# Altium footprint library Connectors.PcbLib: 69 footprints (part 4 of 5)
Each footprint in its own frame and in the unit in brackets; x right, y up, seen from the top. Pads: shape width x height; smd on the part's side, far side on the other; paste and mask are expansions set on the pad; w line width, h text height; cw(c..) or ccw(c..) is an arc to the next point about the centre after c.
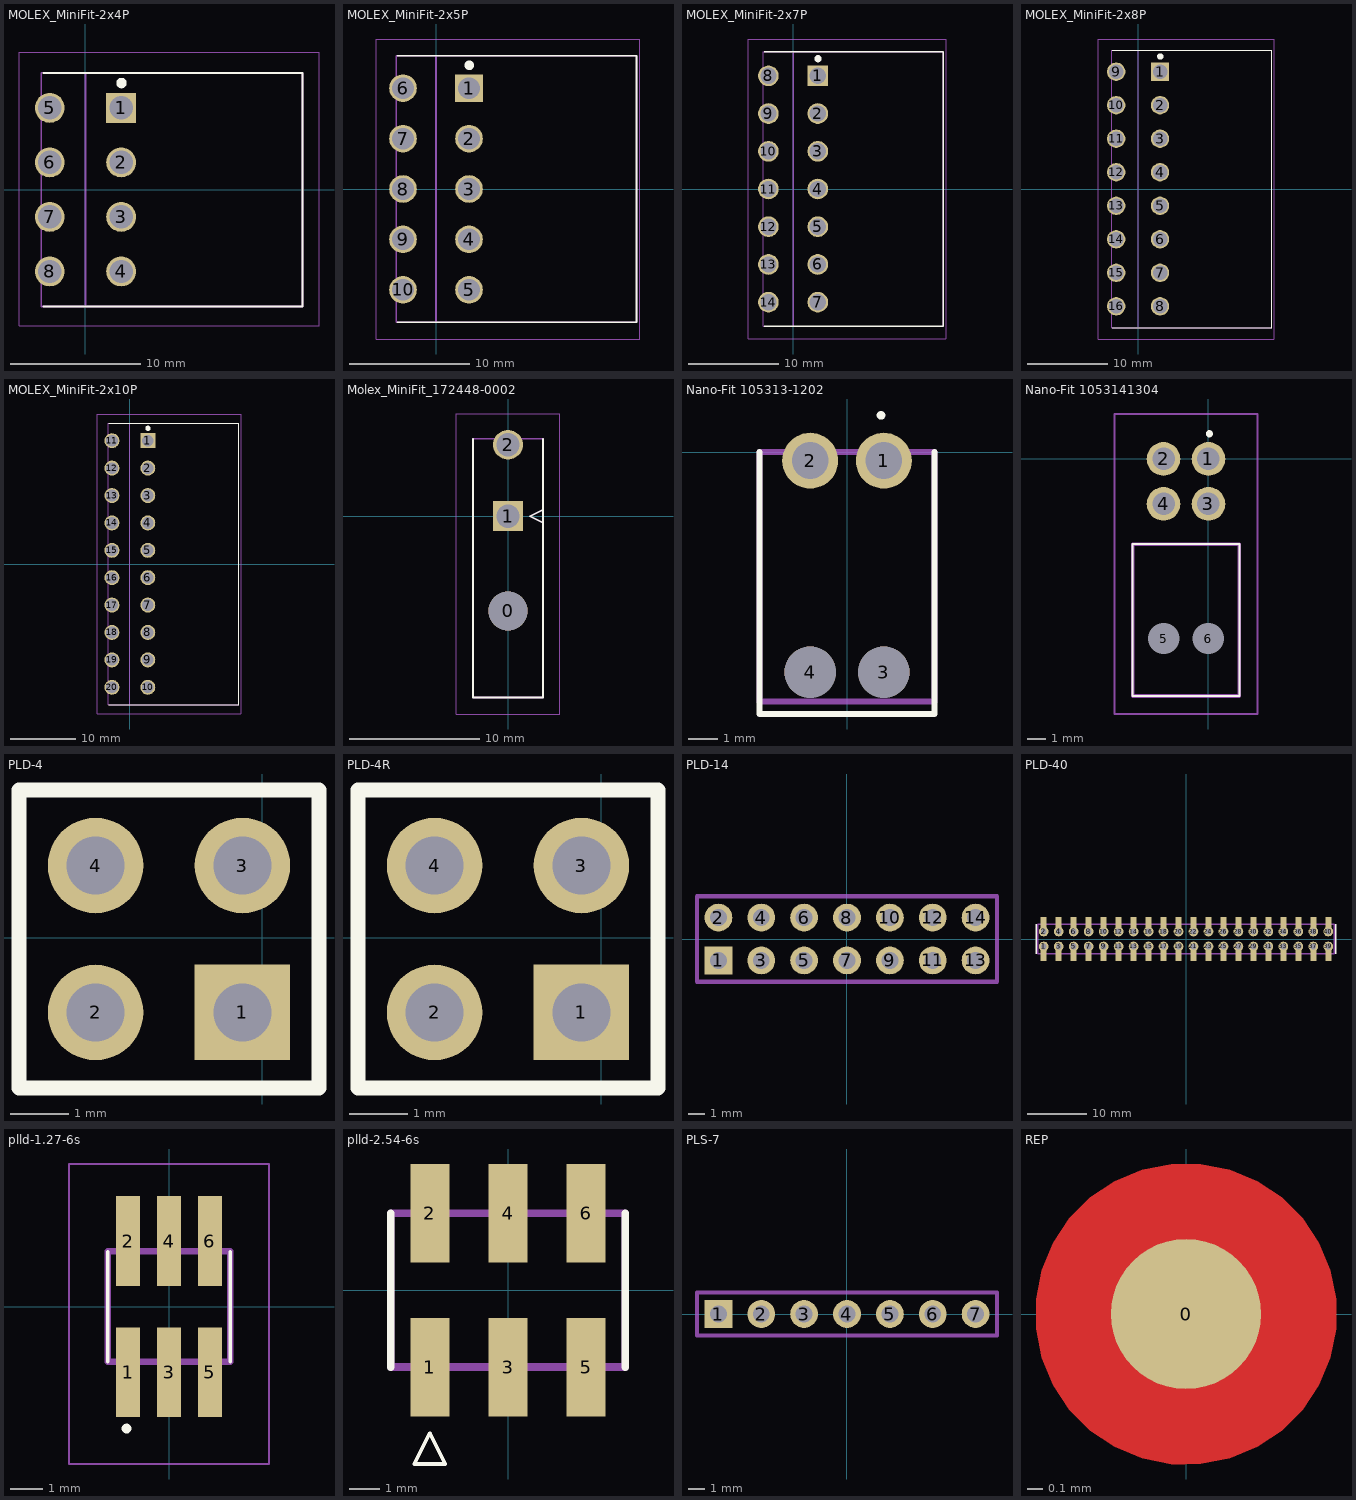
[diagram p3: the footprints below, top view; thin cyan lines are the x and y axes]

## MOLEX_MiniFit-2x4P [mm]
pads (8):
  rect 2.3x2.3 hole 1.8: 1(2.75,6.3)
  round 2.3 hole 1.8: 2(2.75,2.1) 3(2.75,-2.1) 4(2.75,-6.3) 5(-2.75,6.3) 6(-2.75,2.1) 7(-2.75,-2.1) 8(-2.75,-6.3)
Top Overlay:
  lines w0.15: -3.218,-9 16.718,-9 16.718,9 -3.218,9
  lines w0.4: 2.775,8.01 cw(c2.775,8.21) 2.775,8.41 cw(c2.775,8.21) 2.775,8.01
Top 3D Body (Mech13):
  lines w0.127: -3.4,-9 -3.4,9 16.718,9 16.718,-9 -3.4,-9
  lines w0.15: 0,-9 0,9
Mechanical 15:
  lines w0.05: -5.119,-10.5 17.988,-10.5 17.988,10.6 -5.119,10.6 -5.119,-10.5
3D body "MiniFit-2x4P.stp": height 12, standoff -3, extent -3.375,-9 16.575,9

## MOLEX_MiniFit-2x5P [mm]
pads (10):
  rect 2.3x2.3 hole 1.8: 1(2.75,8.4)
  round 2.3 hole 1.8: 2(2.75,4.2) 3(2.75,0) 4(2.75,-4.2) 5(2.75,-8.4) 6(-2.75,8.4) 7(-2.75,4.2) 8(-2.75,0) 9(-2.75,-4.2) 10(-2.75,-8.4)
Top Overlay:
  lines w0.15: -3.218,-11.1 16.718,-11.1 16.718,11.1 -3.218,11.1
  lines w0.4: 2.775,10.11 cw(c2.775,10.31) 2.775,10.51 cw(c2.775,10.31) 2.775,10.11
Top 3D Body (Mech13):
  lines w0.127: -3.3,-11.1 -3.3,11.1 16.718,11.1 16.718,-11.1 -3.3,-11.1
  lines w0.15: 0,-11.1 0,11.1
Mechanical 15:
  lines w0.05: -5,-12.5 17,-12.5 17,12.5 -5,12.5 -5,-12.5
3D body "MiniFit-2x5P.stp": height 12, standoff -3, extent -3.3,-11.1 16.65,11.1

## MOLEX_MiniFit-2x7P [mm]
pads (14):
  rect 2.3x2.3 hole 1.8: 1(2.75,12.6)
  round 2.3 hole 1.8: 2(2.75,8.4) 3(2.75,4.2) 4(2.75,0) 5(2.75,-4.2) 6(2.75,-8.4) 7(2.75,-12.6) 8(-2.75,12.6) 9(-2.75,8.4) 10(-2.75,4.2) 11(-2.75,0) 12(-2.75,-4.2) 13(-2.75,-8.4) 14(-2.75,-12.6)
Top Overlay:
  lines w0.15: -3.218,-15.3 16.718,-15.3 16.718,15.3 -3.218,15.3
  lines w0.4: 2.775,14.31 ccw(c2.775,14.51) 2.775,14.71 ccw(c2.775,14.51) 2.775,14.31
Top 3D Body (Mech13):
  lines w0.127: -3.3,-15.3 16.718,-15.3 16.718,15.3 -3.3,15.3 -3.3,-15.3
  lines w0.15: 0,-15.3 0,15.3
Mechanical 15:
  lines w0.05: -5,-16.7 -5,16.7 17,16.7 17,-16.7 -5,-16.7
3D body "MiniFit-2x7P.stp": height 12, standoff -3, extent -3.25,-15.3 16.7,15.3

## MOLEX_MiniFit-2x8P [mm]
pads (16):
  rect 2.3x2.3 hole 1.8: 1(2.75,14.7)
  round 2.3 hole 1.8: 2(2.75,10.5) 3(2.75,6.3) 4(2.75,2.1) 5(2.75,-2.1) 6(2.75,-6.3) 7(2.75,-10.5) 8(2.75,-14.7) 9(-2.75,14.7) 10(-2.75,10.5) 11(-2.75,6.3) 12(-2.75,2.1) 13(-2.75,-2.1) 14(-2.75,-6.3) 15(-2.75,-10.5) 16(-2.75,-14.7)
Top Overlay:
  lines w0.15: -3.218,-17.4 16.718,-17.4 16.718,17.4 -3.218,17.4
  lines w0.4: 2.775,16.41 ccw(c2.775,16.61) 2.775,16.81 ccw(c2.775,16.61) 2.775,16.41
Top 3D Body (Mech13):
  lines w0.127: -3.3,-17.4 16.718,-17.4 16.718,17.4 -3.3,17.4 -3.3,-17.4
  lines w0.15: 0,-17.4 0,17.4
Mechanical 15:
  lines w0.05: -5,-18.8 -5,18.8 17,18.8 17,-18.8 -5,-18.8
3D body "MiniFit-2x8P.stp": height 12, standoff -3, extent -3.25,-17.4 16.7,17.4

## MOLEX_MiniFit-2x10P [mm]
pads (20):
  rect 2.3x2.3 hole 1.8: 1(2.75,18.9)
  round 2.3 hole 1.8: 2(2.75,14.7) 3(2.75,10.5) 4(2.75,6.3) 5(2.75,2.1) 6(2.75,-2.1) 7(2.75,-6.3) 8(2.75,-10.5) 9(2.75,-14.7) 10(2.75,-18.9) 11(-2.75,18.9) 12(-2.75,14.7) 13(-2.75,10.5) 14(-2.75,6.3) 15(-2.75,2.1) 16(-2.75,-2.1) 17(-2.75,-6.3) 18(-2.75,-10.5) 19(-2.75,-14.7) 20(-2.75,-18.9)
Top Overlay:
  lines w0.15: -3.218,-21.6 16.718,-21.6 16.718,21.6 -3.218,21.6
  lines w0.4: 2.775,20.61 ccw(c2.775,20.81) 2.775,21.01 ccw(c2.775,20.81) 2.775,20.61
Top 3D Body (Mech13):
  lines w0.127: -3.3,-21.6 16.718,-21.6 16.718,21.6 -3.3,21.6 -3.3,-21.6
  lines w0.15: 0,-21.6 0,21.6
Mechanical 15:
  lines w0.05: -5,-23 -5,23 17,23 17,-23 -5,-23
3D body "MiniFit-2x10P.stp": height 12, standoff -2.9, extent -3.25,-21.6 16.7,21.6

## Molex_MiniFit_172448-0002 [mm]
pads (3):
  round 3 hole 3 unplated: 0(0,-7.3)
  rect 2.3x2.3 hole 1.8: 1(0,0)
  round 2.3 hole 1.8: 2(0,5.5)
Top Overlay:
  lines w0.127: -2.7,5.968 -2.7,-13.968 2.7,-13.968 2.7,5.968 ; 1.7,0 2.7,-0.5 2.7,0.5 1.7,0
Top 3D Body (Mech13):
  lines w0.127: -2.7,-13.968 2.7,-13.968 2.7,5.968 -2.7,5.968 -2.7,-13.968 ; 1.7,0 2.7,-0.5 2.7,0.5 1.7,0
Mechanical 15:
  lines w0.05: -3.97,-15.238 3.97,-15.238 3.97,7.869 -3.97,7.869 -3.97,-15.238
3D body "172448-0002.stp": height 11.33, standoff -3.67, extent -2.66,-13.92 3.137,6.015

## Nano-Fit 105313-1202 [mm]
pads (4):
  round 1.9 hole 1.25: 1(1.25,-0.29) 2(-1.25,-0.29)
  round 1.75 hole 1.75 unplated: 3(1.25,-7.47) 4(-1.25,-7.47)
Top Overlay:
  circle w0.2: c1.154,1.248 r0.045
  lines w0.2: -2.97,0 -2.97,-8.89 2.97,-8.89 2.97,0
Top 3D Body (Mech13):
  lines w0.2: -2.97,-8.46 -2.97,0 2.97,0 2.97,-8.46 -2.97,-8.46
3D body "105313-1202.stp": height 6.5, standoff -3.34, extent -2.97,-12.09 2.97,0.068

## Nano-Fit 1053141304 [mm]
pads (6):
  round 1.875 hole 1.25: 1(0,0) 2(-2.5,0) 3(0,-2.5) 4(-2.5,-2.5)
  round 0.875 hole 1.75 unplated: 5(-2.5,-9.99) 6(0,-9.99)
Top Overlay:
  lines w0.1: -4.22,-13.19 -4.22,-4.74 1.72,-4.74 1.72,-13.19 -4.22,-13.19
  lines w0.2: -0.05,1.4 ccw(c0.05,1.4) 0.15,1.4 ccw(c0.05,1.4) -0.05,1.4
Top 3D Body (Mech13):
  lines w0.2: -4.22,-13.19 -4.22,-4.74 1.72,-4.74 1.72,-13.19 -4.22,-13.19
Mechanical 15:
  lines w0.1: -5.22,-14.19 -5.22,2.5 2.72,2.5 2.72,-14.19 -5.22,-14.19
3D body "105314-1104.stp": height 9.03, standoff -3.31, extent -4.22,-14.35 1.72,0.307

## PLD-4 [mm]
pads (4):
  rect 1.65x1.65 hole 1 mask+0.05: 1(-0.338,-1.294)
  round 1.65 hole 1 mask+0.05: 2(-2.878,-1.294) 3(-0.338,1.246) 4(-2.878,1.246)
Top Overlay:
  lines w0.254: -4.2,-2.6 -4.2,2.552 0.985,2.552 0.985,-2.6 -4.2,-2.6
3D body "PLD-4_(DS1021_CONNFLY).stp": height 8.7, standoff -3, extent -4.148,-2.564 0.932,2.516

## PLD-4R [mm]
pads (4):
  rect 1.65x1.65 hole 1 mask+0.05: 1(-0.338,-1.294)
  round 1.65 hole 1 mask+0.05: 2(-2.878,-1.294) 3(-0.338,1.246) 4(-2.878,1.246)
Top Overlay:
  lines w0.254: -4.2,-2.6 -4.2,2.552 0.985,2.552 0.985,-2.6 -4.2,-2.6
3D body "PLD-4RD_(DS1022_CONNFLY).stp": height 5.08, standoff -3, extent -12.9,-2.54 0,2.54

## PLD-14 [mm]
pads (14):
  rect 1.65x1.65 hole 1 mask+0.05: 1(-7.62,-1.27)
  round 1.65 hole 1 mask+0.05: 2(-7.62,1.27) 3(-5.08,-1.27) 4(-5.08,1.27) 5(-2.54,-1.27) 6(-2.54,1.27) 7(0,-1.27) 8(0,1.27) 9(2.54,-1.27) 10(2.54,1.27) 11(5.08,-1.27) 12(5.08,1.27) 13(7.62,-1.27) 14(7.62,1.27)
Top 3D Body (Mech13):
  lines w0.25: -8.89,-2.54 -8.89,2.54 8.89,2.54 8.89,-2.54 -8.89,-2.54
3D body "PLD-14.step": height 8.6, standoff -3, extent -8.89,-2.54 8.89,2.54

## PLD-40 [mm]
pads (80):
  rect 1.02x1.85 smd: 1(-24.13,-2.825) 2(-24.13,2.825) 3(-21.59,-2.825) 4(-21.59,2.825) 5(-19.05,-2.825) 6(-19.05,2.825) 7(-16.51,-2.825) 8(-16.51,2.825) 9(-13.97,-2.825) 10(-13.97,2.825) 11(-11.43,-2.825) 12(-11.43,2.825) 13(-8.89,-2.825) 14(-8.89,2.825) 15(-6.35,-2.825) 16(-6.35,2.825) 17(-3.81,-2.825) 18(-3.81,2.825) 19(-1.27,-2.825) 20(-1.27,2.825) 21(1.27,-2.825) 22(1.27,2.825) 23(3.81,-2.825) 24(3.81,2.825) 25(6.35,-2.825) 26(6.35,2.825) 27(8.89,-2.825) 28(8.89,2.825) 29(11.43,-2.825) 30(11.43,2.825) 31(13.97,-2.825) 32(13.97,2.825) 33(16.51,-2.825) 34(16.51,2.825) 35(19.05,-2.825) 36(19.05,2.825) 37(21.59,-2.825) 38(21.59,2.825) 39(24.13,-2.825) 40(24.13,2.825)
  round 1.65 hole 1 mask+0.05: 1(-24.13,-1.27) 2(-24.13,1.27) 3(-21.59,-1.27) 4(-21.59,1.27) 5(-19.05,-1.27) 6(-19.05,1.27) 7(-16.51,-1.27) 8(-16.51,1.27) 9(-13.97,-1.27) 10(-13.97,1.27) 11(-11.43,-1.27) 12(-11.43,1.27) 13(-8.89,-1.27) 14(-8.89,1.27) 15(-6.35,-1.27) 16(-6.35,1.27) 17(-3.81,-1.27) 18(-3.81,1.27) 19(-1.27,-1.27) 20(-1.27,1.27) 21(1.27,-1.27) 22(1.27,1.27) 23(3.81,-1.27) 24(3.81,1.27) 25(6.35,-1.27) 26(6.35,1.27) 27(8.89,-1.27) 28(8.89,1.27) 29(11.43,-1.27) 30(11.43,1.27) 31(13.97,-1.27) 32(13.97,1.27) 33(16.51,-1.27) 34(16.51,1.27) 35(19.05,-1.27) 36(19.05,1.27) 37(21.59,-1.27) 38(21.59,1.27) 39(24.13,-1.27) 40(24.13,1.27)
Top Overlay:
  lines w0.254: -25.44,-2.5 -25.44,2.5 ; 25.44,-2.5 25.44,2.5
Top 3D Body (Mech13):
  lines w0.254: -25.14,-2.5 25.14,-2.5 25.14,2.5 -25.14,2.5 -25.14,-2.5
3D body "PLD-40.step": height 8.6, standoff -3, extent -25.4,-2.54 25.4,2.54

## plld-1.27-6s [mm]
pads (6):
  rect 0.74x2.79 smd: 1(-1.27,-2.035) 2(-1.27,2.035) 3(0,-2.035) 4(0,2.035) 5(1.27,-2.035) 6(1.27,2.035)
Top Overlay:
  circle w0.2: c-1.32,-3.785 r0.05
  lines w0.1: -1.905,-1.715 -1.905,1.715 ; 1.905,-1.715 1.905,1.715
Top 3D Body (Mech13):
  lines w0.2: -1.905,-1.715 1.905,-1.715 1.905,1.715 -1.905,1.715 -1.905,-1.715
Mechanical 15:
  lines w0.05: -3.105,-4.885 3.105,-4.885 3.105,4.43 -3.105,4.43 -3.105,-4.885
3D body "FTS-103-01-F-DV-TR.stp": height 4.32, standoff 0, extent -1.905,-3.251 1.905,3.251

## plld-2.54-6s [mm]
pads (6):
  rect 1.27x3.2 smd: 1(-2.54,-2.5) 2(-2.54,2.5) 3(0,-2.5) 4(0,2.5) 5(2.54,-2.5) 6(2.54,2.5)
Top Overlay:
  lines w0.127: -3.04,-5.65 -2.54,-4.65 -2.04,-5.65 -3.04,-5.65
  lines w0.254: -3.81,-2.5 -3.81,2.5 ; 3.81,-2.5 3.81,2.5
Top 3D Body (Mech13):
  lines w0.254: -3.81,-2.5 -3.81,2.5 3.81,2.5 3.81,-2.5 -3.81,-2.5
3D body "1241050-3.stp": height 10.21, standoff -0.01, extent -3.81,-3.81 3.81,3.81

## PLS-7 [mm]
pads (7):
  rect 1.65x1.65 hole 1 mask+0.05: 1(-7.62,0)
  round 1.65 hole 1 mask+0.05: 2(-5.08,0) 3(-2.54,0) 4(0,0) 5(2.54,0) 6(5.08,0) 7(7.62,0)
Top 3D Body (Mech13):
  lines w0.25: -8.89,-1.27 8.89,-1.27 8.89,1.27 -8.89,1.27 -8.89,-1.27
3D body "PLS-7.stp": height 8.6, standoff -3, extent -8.89,-1.27 8.89,1.27

## REP [mm]
pads (1):
  round 1 smd paste+0 mask+0.5: 0(0,0)
Top Layer:
  pour cut-out: 0,-1 -0.098,-1 -0.292,-0.962 -0.474,-0.886 -0.637,-0.777 -0.777,-0.637 -0.886,-0.474 -0.962,-0.292 -1,-0.098 -1,0 -1,0.098 -0.962,0.292 -0.886,0.474 -0.777,0.637 -0.637,0.777 -0.474,0.886 -0.292,0.962 -0.098,1 0,1 0.098,1 0.292,0.962 0.474,0.886 0.637,0.777 0.777,0.637 0.886,0.474 0.962,0.292 1,0.098 1,0 1,-0.098 0.962,-0.292 0.886,-0.474 0.777,-0.637 0.637,-0.777 0.474,-0.886 0.292,-0.962 0.098,-1